# Altium footprint library GZ7_1_x.PcbLib: 61 footprints (part 2 of 4)
Each footprint in its own frame and in the unit in brackets; x right, y up, seen from the top. Pads: shape width x height; smd on the part's side, far side on the other; paste and mask are expansions set on the pad; w line width, h text height; cw(c..) or ccw(c..) is an arc to the next point about the centre after c.
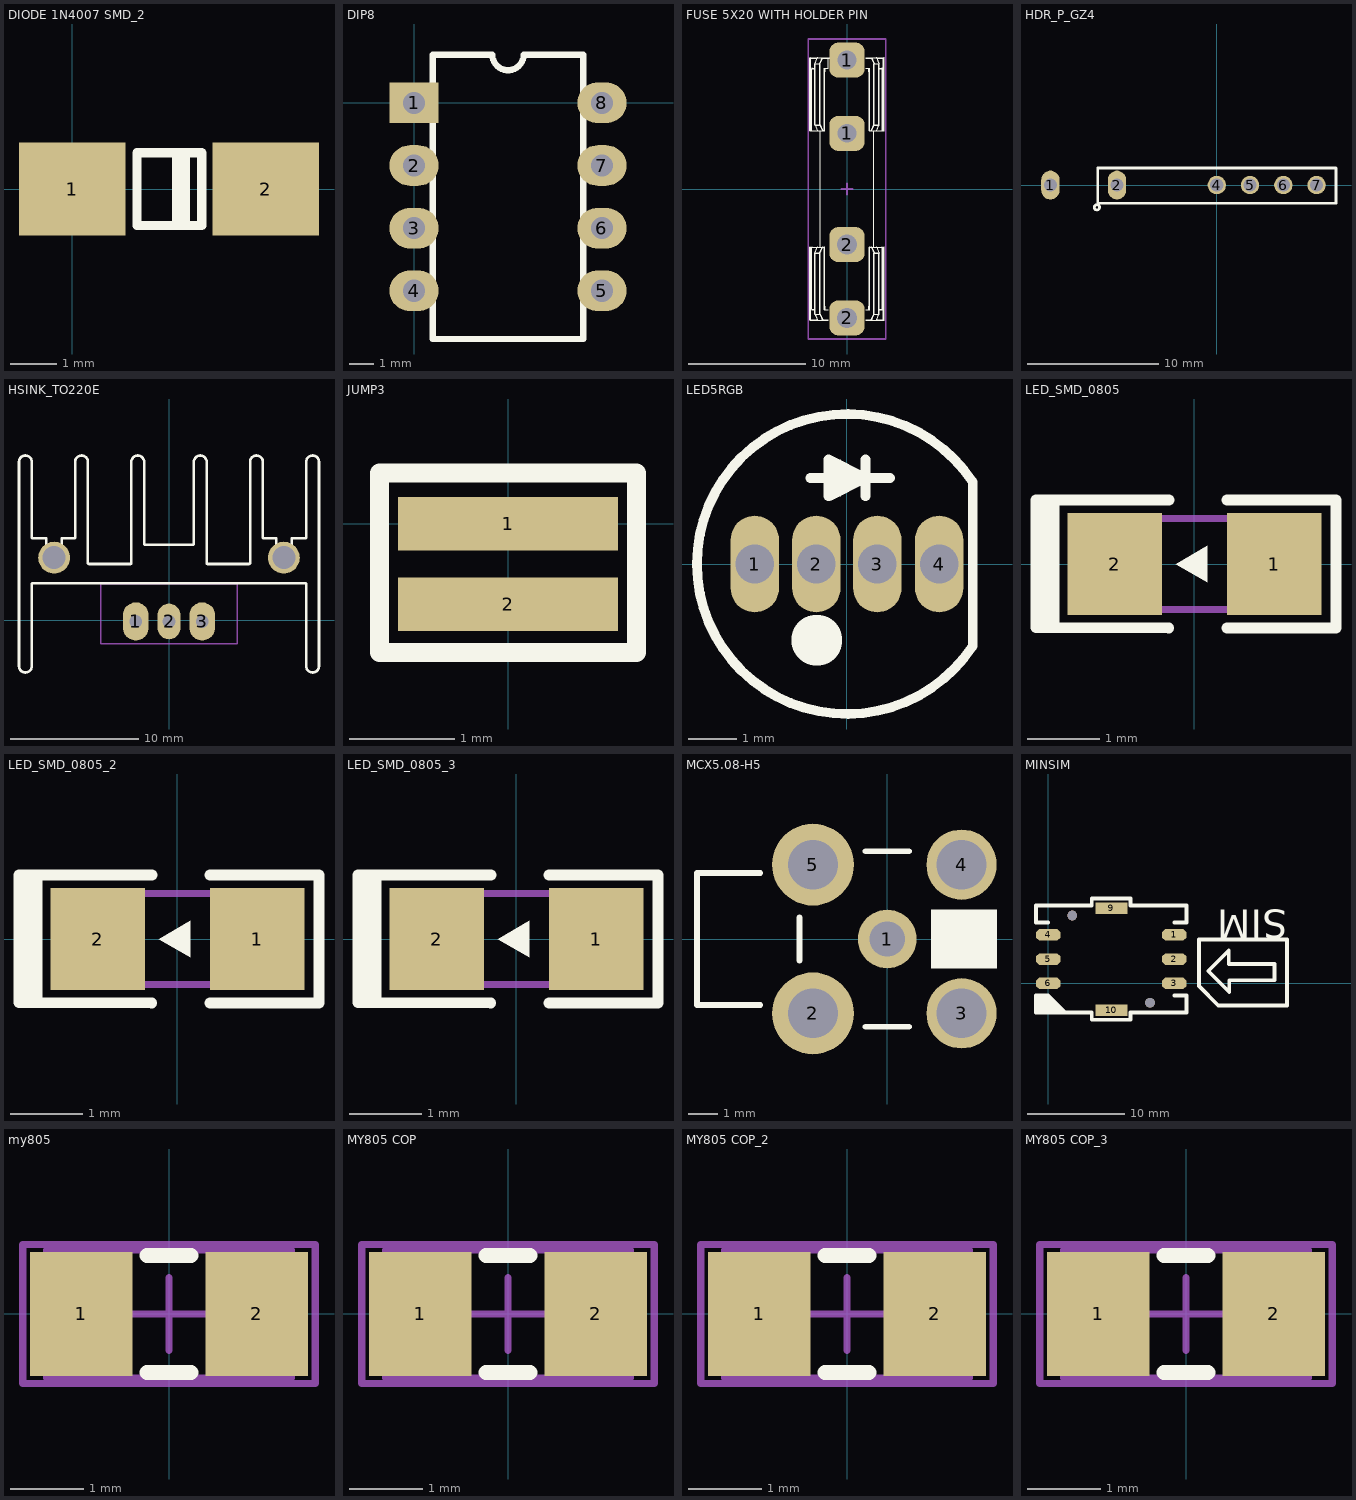
[diagram p1: the footprints below, top view; thin cyan lines are the x and y axes]

## DIODE 1N4007 SMD_2 [mm]
pads (2):
  rect 2.3x2 smd: 1(0,0) 2(4.175,0)
Top Overlay:
  rectangle: 2.157,-0.81 2.538,0.827
  lines w0.2: 1.395,-0.787 1.395,0.78 2.792,0.78 2.792,-0.787 1.395,-0.787
3D body "User Library-DO-214AC_SMA.step": height 2.16, standoff -0.04, extent -0.54,-1.36 4.46,1.34

## DIP8 [mm]
height 15
pads (8):
  rect 2x1.651 hole 0.9: 1(0,0)
  oval 2x1.651 hole 0.9: 2(0,-2.54) 3(0,-5.08) 4(0,-7.62) 5(7.62,-7.62) 6(7.62,-5.08) 7(7.62,-2.54) 8(7.62,0)
Top Overlay:
  lines w0.254: 0.762,-9.576 0.762,1.956 3.175,1.956 ccw(c3.81,1.956) 4.445,1.956 6.858,1.956 6.858,-9.576 0.762,-9.576
3D body "SW3DPS-DIP8-DEFAULT.step": height 4.19, standoff -2.67, extent -0.127,-9.525 7.747,1.905

## FUSE 5X20 WITH HOLDER PIN [mm] "Dsigner : Abbas Basereh"
height 8
pads (4):
  rrect50% 3x3 hole 1.6: 1(0,4.75) 1(0,11)
  rrect50% 3x3 hole 1.7: 2(0,-11) 2(0,-4.75)
Top Overlay:
  drawing of 353 lines, arcs and shapes, not listed
Mechanical 15:
  lines w0.15: -0.5,0 0.5,0 ; 0,-0.5 0,0.5 ; -3.3,-12.8 3.3,-12.8 3.3,12.8 -3.3,12.8 -3.3,-12.8
3D body "User Library-Clips FC-201 with fuse 5x20.STEP": height 8.63, standoff -3.56, extent -3.173,-11.689 3.174,11.689

## HDR_P_GZ4 [mm] "HEADER FEMALE pitch: 2.54mm"
pads (6):
  oval 1.4x2.2 / inner round 0 / far side oval 1.4x2.2 hole 1 mask+0.1: 1(-12.7,0) 2(-7.62,0)
  round 1.4 / inner round 1.4 / far side oval 1.4x2.2 hole 1 mask+0.1: 4(0,0) 5(2.54,0) 6(5.08,0) 7(7.62,0)
Top Overlay:
  circle w0.2: c-9.15,-1.7 r0.2
  lines w0.2: -9.1,-1.4 -9.1,1.3 9.1,1.3 9.1,-1.4 -9.1,-1.4
3D body "female_header_a-bl254-eg-g02d.stp": height 8.5, standoff -3.2, extent 3.685,-1.3 9.015,1.2
3D body "female_header_a-bl254-eg-g03d.stp": height 8.5, standoff -3.2, extent -9.015,-1.3 -1.145,1.2
3D body "female_header_a-bl254-eg-g02d.stp": height 8.5, standoff -3.2, extent -1.395,-1.3 3.935,1.2

## HSINK_TO220E [mm] "HEATSINK, TO-220, Epoxy meets UL94"
height 17
pads (5):
  oval 2x3 hole 1: 1(-2.6,-0.1) 3(2.6,-0.1)
  oval 1.8x2.8 hole 1: 2(0,-0.1)
  round 2.5 / inner round 0 / far side round 6 hole 1.8 unplated: ""(-9,4.9) ""(9,4.9)
Top Overlay:
  circle w0.2: c9,4.9 r0.5
  circle w0.2: c-9,4.9 r0.5
  lines w0.2: -11.75,-3.6 ccw(c-11.25,-3.6) -11.25,-4.1 ccw(c-11.25,-3.6) -10.75,-3.6 -10.75,2.8 cw(c-10.65,2.8) -10.65,2.9 10.65,2.9 cw(c10.65,2.8) 10.75,2.8 10.75,-3.6 ccw(c11.25,-3.6) 11.25,-4.1 ccw(c11.25,-3.6) 11.75,-3.6 11.75,12.4 ccw(c11.25,12.4) 11.25,12.9 ccw(c11.25,12.4) 10.75,12.4 10.75,6.5 cw(c10.65,6.5) 10.65,6.4 9.6,6.4 9.6,5 cw(c9,5) 9,4.4 cw(c9,5) 8.4,5 8.4,6.4 7.45,6.4 cw(c7.45,6.5) 7.35,6.5 7.35,12.4 ccw(c6.85,12.4) 6.85,12.9 ccw(c6.85,12.4) 6.35,12.4 6.35,4.5 cw(c6.25,4.5) 6.25,4.4 3.05,4.4 cw(c3.05,4.5) 2.95,4.5 2.95,12.4 ccw(c2.45,12.4) 2.45,12.9 ccw(c2.45,12.4) 1.95,12.4 1.95,6 cw(c1.85,6) 1.85,5.9 -1.85,5.9 cw(c-1.85,6) -1.95,6 -1.95,12.4 ccw(c-2.45,12.4) -2.45,12.9 ccw(c-2.45,12.4) -2.95,12.4 -2.95,4.5 cw(c-3.05,4.5) -3.05,4.4 -6.25,4.4 cw(c-6.25,4.5) -6.35,4.5 -6.35,12.4 ccw(c-6.85,12.4) -6.85,12.9 ccw(c-6.85,12.4) -7.35,12.4 -7.35,6.5 cw(c-7.45,6.5) -7.45,6.4 -8.4,6.4 -8.4,5 cw(c-9,5) -9,4.4 cw(c-9,5) -9.6,5 -9.6,6.4 -10.65,6.4 cw(c-10.65,6.5) -10.75,6.5 -10.75,12.4 ccw(c-11.25,12.4) -11.25,12.9 ccw(c-11.25,12.4) -11.75,12.4 -11.75,-3.6
Mechanical 13:
  lines w0.1: -5.35,-1.85 5.35,-1.85 5.35,2.85 -5.35,2.85 -5.35,-1.85
3D body "SW3DPS-TO-220HS-DEFAULT.STEP": height 21.04, standoff -1.31, extent -5.08,-1.651 5.08,2.921
3D body "User Library-YA25.STEP": height 25, standoff -4, extent -11.75,-4.078 11.75,12.922

## JUMP3 [mil]
height 39.37
pads (2):
  rect 82x20 smd: 1(0,0) 2(0,-30)
Top Overlay:
  lines w7: -48,-48 -48,19 48,19 48,-48 -48,-48
Top Solder:
  rectangle: -42.1,-30 39.37,11.23

## LED5RGB [mm] "LED THD 5MM RGB"
pads (4):
  oval 1x2 hole 0.8 mask+0.1: 1(-1.905,0) 2(-0.635,0) 3(0.627,0) 4(1.905,0)
Top Overlay:
  circle w1: c-0.625,-1.575 r0.025
  rectangle: -0.381,1.397 -0.127,2.159
  lines w0.2: -0.762,1.778 0.889,1.778 ; -0.15,1.778 -0.15,1.587 -0.15,1.925 -0.1,1.925 ; -0.025,1.683 -0.025,1.587 -0.025,1.778 0.064,1.778 ; 0.381,1.397 0.381,2.159 ; 2.6,-1.7 2.6,1.7 ; 2.6,-1.688 cw(c0,0) 2.6,1.688 ; -0.381,1.397 -0.381,2.159 0.381,1.778 -0.381,1.397
3D body "User Library-LED RGB.step": height 9.6, standoff -5, extent -2.827,-2.95 2.627,2.95

## LED_SMD_0805 [mm] "SMD Mono-color Chip LED, body 2.0x1.25mm"
height 0.7
pads (2):
  rect 1.3x1.4 smd: 1(1.102,0) 2(-1.091,0)
Top Overlay:
  region: -0.254,0 0.179,-0.25 0.179,0.25
  lines w0.15: -2.075,-0.875 -2.075,0.879 -1.98,0.879 ; -2.027,0.879 -2.175,0.879 -2.175,-0.875 -0.35,-0.879 ; -1.98,-0.635 -1.98,0.635 ; -1.925,-0.875 -1.925,0.879 -1.98,0.879 ; -0.348,0.879 -1.736,0.879 -1.98,0.879 ; 1.906,0.879 0.452,0.879 1.95,0.879 1.95,-0.879 0.452,-0.879 1.906,-0.879 1.925,-0.879 ; -1.98,0.879 -1.98,-0.875 -1.98,0.879
Mechanical 13:
  lines w0.1: -0.998,-0.625 -0.998,0.625 1.102,0.625 1.102,-0.625 -0.998,-0.625
3D body "WL-SMCW_0805_LED.stp": height 0.7, standoff 0, extent -1.025,-0.625 0.975,0.625

## LED_SMD_0805_2 [mm]
pads (2):
  rect 1.3x1.4 smd: 1(1.102,0) 2(-1.091,0)
Top Overlay:
  region: -0.254,0 0.179,-0.25 0.179,0.25
  lines w0.15: -2.075,-0.875 -2.075,0.879 -1.98,0.879 ; -2.027,0.879 -2.175,0.879 -2.175,-0.875 -0.35,-0.879 ; -1.98,-0.635 -1.98,0.635 ; -1.925,-0.875 -1.925,0.879 -1.98,0.879 ; -0.348,0.879 -1.736,0.879 -1.98,0.879 ; 1.906,0.879 0.452,0.879 1.95,0.879 1.95,-0.879 0.452,-0.879 1.906,-0.879 1.925,-0.879 ; -1.98,0.879 -1.98,-0.875 -1.98,0.879
Mechanical 13:
  lines w0.1: -0.998,-0.625 1.102,-0.625 1.102,0.625 -0.998,0.625 -0.998,-0.625
3D body "WL-SMCW_0805_LED.stp": height 0.7, standoff 0, extent -1.025,-0.625 0.975,0.625

## LED_SMD_0805_3 [mm]
pads (2):
  rect 1.3x1.4 smd: 1(1.102,0) 2(-1.091,0)
Top Overlay:
  region: -0.254,0 0.179,-0.25 0.179,0.25
  lines w0.15: -2.075,-0.875 -2.075,0.879 -1.98,0.879 ; -2.027,0.879 -2.175,0.879 -2.175,-0.875 -0.35,-0.879 ; -1.98,-0.635 -1.98,0.635 ; -1.925,-0.875 -1.925,0.879 -1.98,0.879 ; -0.348,0.879 -1.736,0.879 -1.98,0.879 ; 1.906,0.879 0.452,0.879 1.95,0.879 1.95,-0.879 0.452,-0.879 1.906,-0.879 1.925,-0.879 ; -1.98,0.879 -1.98,-0.875 -1.98,0.879
Mechanical 13:
  lines w0.1: -0.998,-0.625 -0.998,0.625 1.102,0.625 1.102,-0.625 -0.998,-0.625
3D body "WL-SMCW_0805_LED.stp": height 0.7, standoff 0, extent -1.025,-0.625 0.975,0.625

## MCX5.08-H5 [mm] "Connector; RF Coaxial, MCX, Thru-Hole; 5 Position; Right-Angle"
height 5.85
pads (5):
  round 2 hole 1.2: 1(0,0)
  round 2.8 hole 1.7: 2(-2.54,-2.54) 5(-2.54,2.54)
  round 2.4 hole 1.7: 3(2.54,-2.54) 4(2.54,2.54)
Top Overlay:
  rectangle: 1.5,-1 3.75,1
  lines w0.2: -4.34,-2.25 -6.5,-2.25 -6.5,2.25 -4.34,2.25 ; -3,-0.74 -3,0.74 ; -0.74,-3 0.74,-3 ; -0.74,3 0.74,3
3D body "User Library-901-143-6RFX.STEP": height 9.17, standoff -4.63, extent -11.6,-3.5 3.5,3.5

## MINSIM [mm]
pads (8):
  oct 2.5x1.2 smd: 1(13,4.99) 2(13,2.49) 3(13,-0.01) 4(0,4.99) 5(0,2.49) 6(0,-0.01)
  rect 3.3x1.2 smd: 9(6.51,7.74) 10(6.51,-2.76)
via 2.5,6.99 diameter 1 hole 1
via 10.5,-2.01 diameter 1 hole 1
Top Overlay:
  lines w0.4: -1.25,-2.5 -0.75,-3 -0.375,-3 -1.25,-2.125 -1.25,-1.75 0,-3 0.5,-3 -1.25,-1.25 ; 0,6.25 -1.25,6.25 -1.25,8 4.5,8 4.5,8.75 8.5,8.75 8.5,8 14.25,8 14.25,6.25 13,6.25 ; 13,-1.25 14.25,-1.25 14.25,-3 8.5,-3 8.5,-3.75 4.5,-3.75 4.5,-3 -1.25,-3 -1.25,-1.25 ; 15.54,0.26 15.54,4.51 ; 18.08,-2.28 24.6,-2.28 ; -1.25,-1.25 0,-1.25 1.625,-2.875 1.125,-2.875 ; 1.125,-2.875 0.625,-2.875 -0.75,-1.5 -0.25,-1.5 1.125,-2.875 ; 15.54,4.51 15.54,-0.29 17.53,-2.28 24.6,-2.28 ; 15.54,4.51 24.6,4.51 24.6,-2.28 ; 16.5,1.25 18.615,3.365 18.615,1.995 23.335,1.995 23.335,0.315 18.665,0.315 18.665,-0.915 16.5,1.25
  text "SIM" at 24.66,8.54 h5
3D body "xb-xknano-1151.stp": height 1.35, standoff -0.3, extent 0.5,-2.925 12.8,7.925

## my805 [mm]
height 1.524
pads (2):
  rect 1.4x1.7 smd: 1(-1.2,0) 2(1.2,0)
Top Overlay:
  lines w0.2: -0.3,-0.8 0.3,-0.8 ; -0.3,0.8 0.3,0.8
Mechanical 13:
  lines w0.1: -1.675,-0.875 -1.675,0.875 1.675,0.875 1.675,-0.875 -1.675,-0.875
Mechanical 15:
  lines w0.1: -0.5,0 0.5,0 ; 0,-0.5 0,0.5 ; -2,-0.95 -2,0.95 2,0.95 2,-0.95 -2,-0.95
3D body "User Library-RES_2013-0805.STEP": height 0.77, standoff 0.01, extent -1.15,-0.675 1.15,0.675

## MY805 COP [mm] "Chip Capacitor, Body 3.2x1.6mm, IPC High Density"
height 1.3
pads (2):
  rect 1.4x1.7 smd: 1(-1.2,0) 2(1.2,0)
Top Overlay:
  lines w0.2: -0.3,-0.8 0.3,-0.8 ; -0.3,0.8 0.3,0.8
Mechanical 13:
  lines w0.1: -1.675,-0.875 -1.675,0.875 1.675,0.875 1.675,-0.875 -1.675,-0.875
Mechanical 15:
  lines w0.1: -0.5,0 0.5,0 ; 0,-0.5 0,0.5 ; -2,-0.95 -2,0.95 2,0.95 2,-0.95 -2,-0.95
3D body "User Library-C0805-2.STEP": height 0.81, standoff 0.01, extent -1,-0.625 1,0.625

## MY805 COP_2 [mm]
pads (2):
  rect 1.4x1.7 smd: 1(-1.2,0) 2(1.2,0)
Top Overlay:
  lines w0.2: -0.3,-0.8 0.3,-0.8 ; -0.3,0.8 0.3,0.8
Mechanical 13:
  lines w0.1: -1.675,-0.875 1.675,-0.875 1.675,0.875 -1.675,0.875 -1.675,-0.875
Mechanical 15:
  lines w0.1: -0.5,0 0.5,0 ; 0,-0.5 0,0.5 ; -2,-0.95 2,-0.95 2,0.95 -2,0.95 -2,-0.95
3D body "User Library-C0805-2.STEP": height 0.81, standoff 0.01, extent -1,-0.625 1,0.625

## MY805 COP_3 [mm]
pads (2):
  rect 1.4x1.7 smd: 1(-1.2,0) 2(1.2,0)
Top Overlay:
  lines w0.2: -0.3,-0.8 0.3,-0.8 ; -0.3,0.8 0.3,0.8
Mechanical 13:
  lines w0.1: -1.675,-0.875 1.675,-0.875 1.675,0.875 -1.675,0.875 -1.675,-0.875
Mechanical 15:
  lines w0.1: -0.5,0 0.5,0 ; 0,-0.5 0,0.5 ; -2,-0.95 2,-0.95 2,0.95 -2,0.95 -2,-0.95
3D body "User Library-C0805-2.STEP": height 0.81, standoff 0.01, extent -1,-0.625 1,0.625